# Altium footprint library 13-IC Packages-2smt2e.PcbLib: 86 footprints (part 5 of 6)
Each footprint in its own frame and in the unit in brackets; x right, y up, seen from the top. Pads: shape width x height; smd on the part's side, far side on the other; paste and mask are expansions set on the pad; w line width, h text height; cw(c..) or ccw(c..) is an arc to the next point about the centre after c.
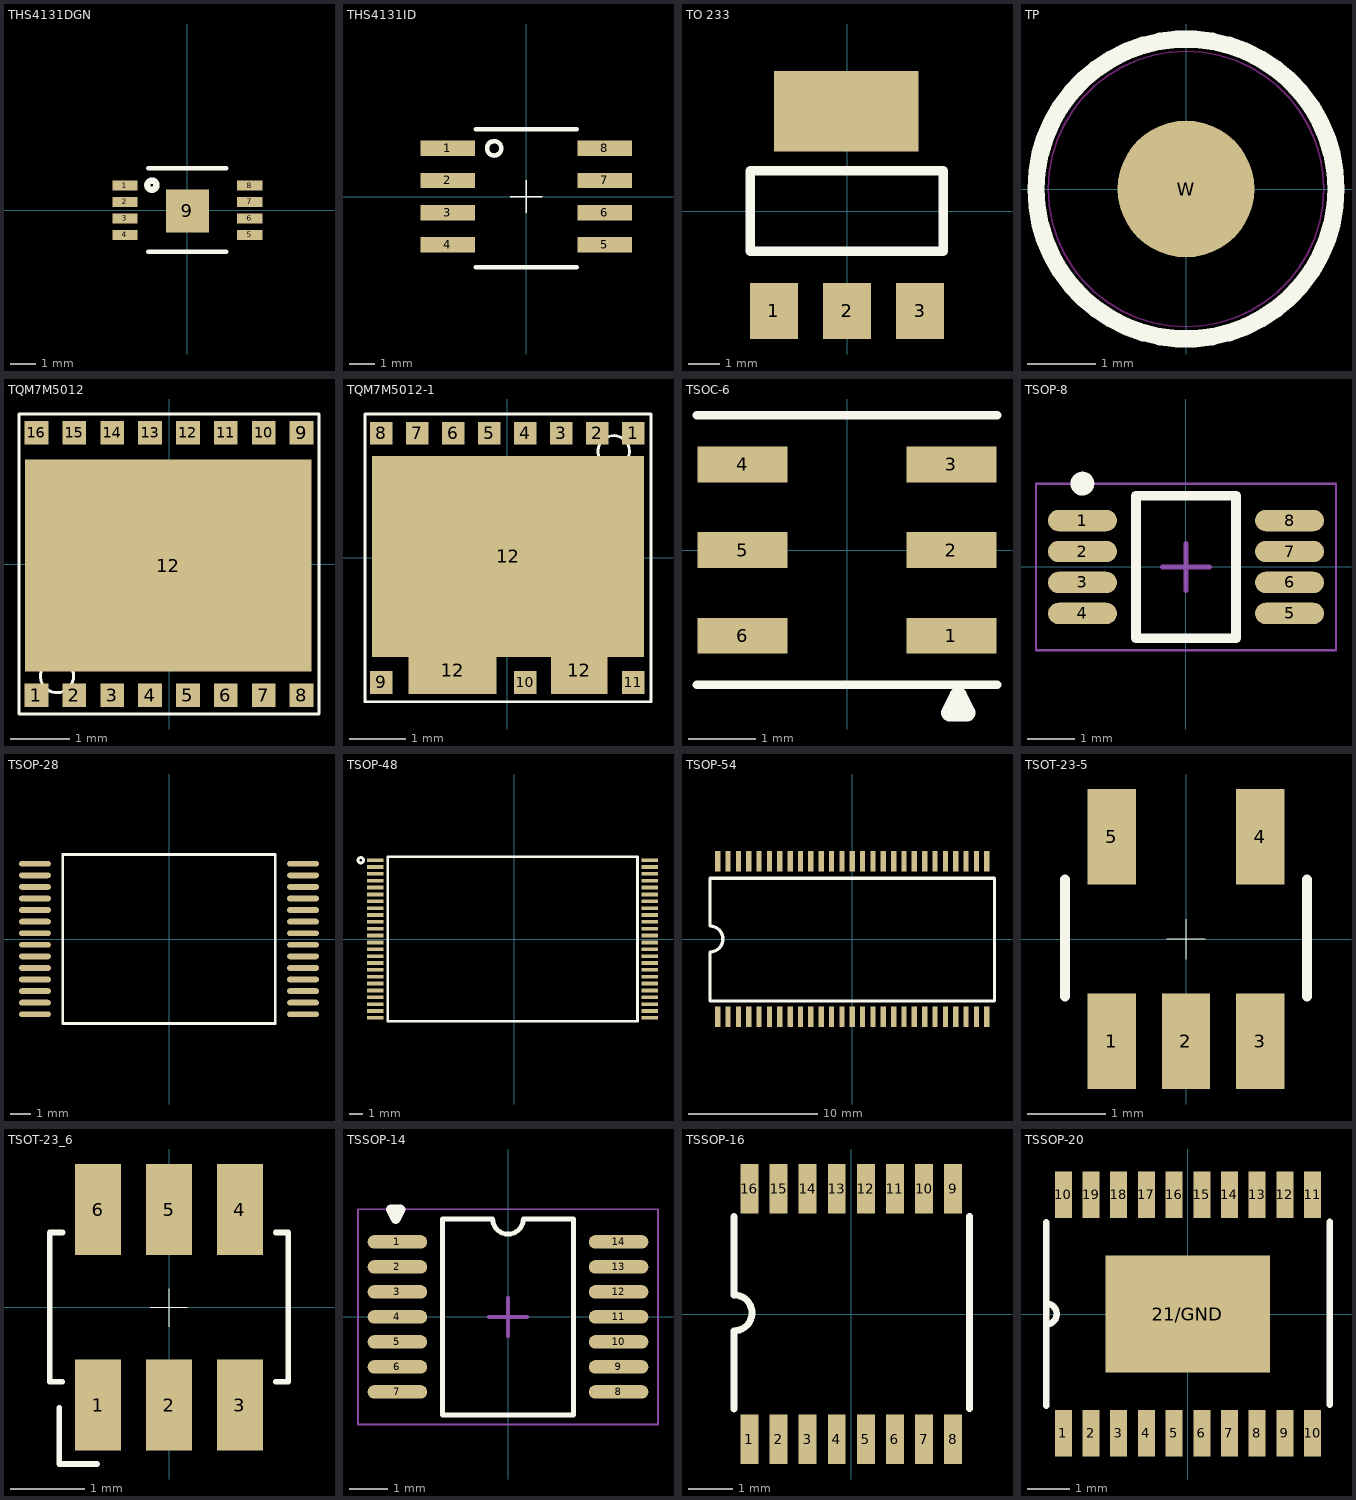
[diagram p4: the footprints below, top view; thin cyan lines are the x and y axes]

## THS4131DGN [mm]
pads (9):
  rect 1x0.4 smd mask+0.07: 1(-2.465,0.975) 2(-2.465,0.325) 3(-2.465,-0.325) 4(-2.465,-0.975) 5(2.465,-0.975) 6(2.465,-0.325) 7(2.465,0.325) 8(2.465,0.975)
  rect 1.7x1.7 smd: 9(0.001,-0.025)
Top Overlay:
  circle w0.254: c-1.399,0.991 r0.18
  lines w0.051: -0.635,0 0.635,0 ; 0,-0.635 0,0.635
  lines w0.178: -1.55,-1.65 1.55,-1.65 ; -1.55,1.65 1.55,1.65
3D body "ths4131-dgn.stp": height 1.07, standoff 0, extent -2.495,-1.524 2.495,1.526

## THS4131ID [mil]
pads (8):
  rect 85x24 smd mask+2.76: 1(-122.05,75) 2(-122.05,25) 3(-122.05,-25) 4(-122.05,-75) 5(122.05,-75) 7(122.05,25) 8(122.05,75)
  rect 85x24 smd: 6(122.05,-25)
Top Overlay:
  circle w7: c-50,75 r11.18
  lines w2: -25,0 25,0 ; 0,-25 0,25
  lines w7: -78.74,-110 78.74,-110 ; -78.74,105 78.74,105
3D body "2-0_85-ths4131.stp": height 0.79, standoff 0, extent 82.13,-91.14 160.87,-58.86
3D body "2-0_85-ths4131.stp": height 0.79, standoff 0, extent 84.13,-42.14 162.87,-9.86
3D body "2-0_85-ths4131.stp": height 0.79, standoff 0, extent 84.13,8.86 162.87,41.14
3D body "2-0_85-ths4131.stp": height 0.79, standoff 0, extent 83.63,59.36 162.37,91.64
3D body "2-0_85-ths4131.stp": height 0.79, standoff 0, extent -161.37,-91.14 -82.63,-58.86
3D body "2-0_85-ths4131.stp": height 0.79, standoff 0, extent -160.87,-41.64 -82.13,-9.36
3D body "2-0_85-ths4131.stp": height 0.79, standoff 0, extent -162.37,8.36 -83.63,40.64
3D body "2-0_85-ths4131.stp": height 0.79, standoff 0, extent -162.37,58.36 -83.63,90.64
3D body "sop-j8.stp": height 58.07, standoff 0, extent -116.93,-96.47 116.92,96.45

## TO 233 [mil]
height 66.93
pads (4):
  rect 60x70 smd mask+2.76: 1(-91,-124.29) 2(0,-124.29) 3(91,-124.29)
  rect 180x100 smd: ""(-1,124.29)
Top Overlay:
  lines w11.81: -120.43,-50 119.57,-50 119.57,50 -120.43,50 -120.43,-50
3D body "sot-233_to261aa.stp": height 70.87, standoff 0, extent -127.95,-138 127.95,137.59

## TP [mm]
height 11.7
pads (1):
  round 2 smd mask+1: W(0,0)
Top Overlay:
  circle w0.254: c0,0 r2.195
Keep-Out Layer:
  circle w0.025: c0,0 r2.017
3D body "1_016-1_016-3_tp.stp": height 0.02, standoff 0, extent -1.5,-1.5 1.5,1.5

## TQM7M5012 [mm]
pads (17):
  rect 0.4x0.4 smd mask+0.051: 1(-2.222,-2.2) 2(-1.587,-2.2) 3(-0.953,-2.2) 4(-0.318,-2.2) 5(0.318,-2.2) 6(0.953,-2.2) 7(1.587,-2.2) 8(2.222,-2.2) 9(2.222,2.2) 10(1.587,2.2) 11(0.953,2.2) 12(0.318,2.2) 13(-0.318,2.2) 14(-0.953,2.2) 15(-1.587,2.2) 16(-2.222,2.2)
  rect 4.8x3.55 smd mask+0.051: 12(-0.013,-0.025)
Top Overlay:
  circle w0.051: c-1.879,-1.88 r0.279
  lines w0.051: -2.515,-2.515 -2.515,2.515 2.515,2.515 2.515,-2.515 -2.515,-2.515
3D body "tqm7m5012.stp": height 0.9, standoff -0.1, extent -2.489,-2.489 2.511,2.511

## TQM7M5012-1 [mm]
pads (14):
  rect 0.4x0.4 smd: 1(2.222,2.2) 2(1.587,2.2) 3(0.953,2.2) 4(0.318,2.2) 5(-0.318,2.2) 6(-0.953,2.2) 7(-1.587,2.2) 8(-2.222,2.2) 9(-2.222,-2.2) 10(0.318,-2.2)
  rect 0.4x0.4 smd mask+0.051: 11(2.222,-2.2)
  rect 1.55x0.85 smd: 12(-0.965,-1.981)
  rect 4.8x3.55 smd: 12(0.013,0.025)
  rect 1x0.85 smd: 12(1.27,-1.981)
Top Overlay:
  circle w0.051: c1.879,1.88 r0.279
  lines w0.051: -2.515,-2.54 2.54,-2.54 2.54,2.54 -2.515,2.54 -2.515,-2.54
3D body "tqm7m5012.stp": height 0.9, standoff -0.1, extent -2.485,-2.5 2.515,2.5

## TSOC-6 [mm]
pads (6):
  rect 1.33x0.53 smd: 1(1.549,-1.27) 2(1.549,0) 3(1.549,1.27) 4(-1.549,1.27) 5(-1.549,0) 6(-1.549,-1.27)
Top Overlay:
  lines w0.127: -2.225,-2 2.225,-2 ; -2.225,2 2.225,2
  lines w0.254: 1.524,-2.413 1.778,-2.413 1.651,-2.159 1.524,-2.413
3D body "tsoc-6.stp": height 1.27, standoff 0.01, extent -2.095,-1.84 2.095,1.79

## TSOP-8 [mm]
pads (8):
  oval 1.45x0.45 smd mask+0.076: 1(-2.175,0.975) 2(-2.175,0.325) 3(-2.175,-0.325) 4(-2.175,-0.975) 5(2.175,-0.975) 6(2.175,-0.325) 7(2.175,0.325) 8(2.175,0.975)
Top Overlay:
  circle w0.25: c-2.175,1.75 r0.125
  lines w0.2: -1.05,-1.5 -1.05,1.5 1.05,1.5 1.05,-1.5 -1.05,-1.5
Mechanical 15:
  lines w0.05: -3.15,-1.75 -3.15,1.75 3.15,1.75 3.15,-1.75 -3.15,-1.75
  lines w0.1: -0.5,0 0.5,0 ; 0,-0.5 0,0.5
3D body "0_45-1_45.stp": height 0.02, standoff 0, extent 1.45,0.75 2.9,1.2
3D body "0_45-1_45.stp": height 0.02, standoff 0, extent 1.45,0.1 2.9,0.55
3D body "0_45-1_45.stp": height 0.02, standoff 0, extent 1.45,-0.55 2.9,-0.1
3D body "0_45-1_45.stp": height 0.02, standoff 0, extent 1.434,-1.165 2.884,-0.715
3D body "0_45-1_45.stp": height 0.02, standoff 0, extent -2.9,-1.2 -1.45,-0.75
3D body "0_45-1_45.stp": height 0.02, standoff 0, extent -2.9,-0.55 -1.45,-0.1
3D body "0_45-1_45.stp": height 0.02, standoff 0, extent -2.9,0.1 -1.45,0.55
3D body "0_45-1_45.stp": height 0.02, standoff 0, extent -2.9,0.75 -1.45,1.2
3D body "ms0p-8l.stp": height 1.1, standoff 0.03, extent -2.45,-1.5 2.45,1.5

## TSOP-28 [mil]
pads (28):
  oval 60x11 smd: 1(-252.5,141.7) 2(-252.5,119.9) 3(-252.5,98.1) 4(-252.5,76.3) 5(-252.5,54.5) 6(-252.5,32.7) 7(-252.5,10.9) 8(-252.5,-10.9) 9(-252.5,-32.7) 10(-252.5,-54.5) 11(-252.5,-76.3) 12(-252.5,-98.1) 13(-252.5,-119.9) 14(-252.5,-141.7) 15(252.5,-141.7) 16(252.5,-119.9) 17(252.5,-98.1) 18(252.5,-76.3) 19(252.5,-54.5) 20(252.5,-32.7) 21(252.5,-10.9) 22(252.5,10.9) 23(252.5,32.7) 24(252.5,54.5) 25(252.5,76.3) 26(252.5,98.1) 27(252.5,119.9) 28(252.5,141.7)
Top Overlay:
  lines w5: -200,-159 200,-159 200,159 -25,159 -200,159 -200,-159
3D body "tsop-28.stp": height 47.24, standoff -0.14, extent -259.84,-155.51 259.84,155.52

## TSOP-48 [mm]
pads (48):
  rect 1.2x0.27 smd: 1(-10.127,5.75) 2(-10.127,5.25) 3(-10.127,4.75) 4(-10.127,4.25) 5(-10.127,3.75) 6(-10.127,3.25) 7(-10.127,2.75) 8(-10.127,2.25) 9(-10.127,1.75) 10(-10.127,1.25) 11(-10.127,0.75) 12(-10.127,0.25) 13(-10.127,-0.25) 14(-10.127,-0.75) 15(-10.127,-1.25) 16(-10.127,-1.75) 17(-10.127,-2.25) 18(-10.127,-2.75) 19(-10.127,-3.25) 20(-10.127,-3.75) 21(-10.127,-4.25) 22(-10.127,-4.75) 23(-10.127,-5.25) 24(-10.127,-5.75) 25(9.873,-5.75) 26(9.873,-5.25) 27(9.873,-4.75) 28(9.873,-4.25) 29(9.873,-3.75) 30(9.873,-3.25) 31(9.873,-2.75) 32(9.873,-2.25) 33(9.873,-1.75) 34(9.873,-1.25) 35(9.873,-0.75) 36(9.873,-0.25) 37(9.873,0.25) 38(9.873,0.75) 39(9.873,1.25) 40(9.873,1.75) 41(9.873,2.25) 42(9.873,2.75) 43(9.873,3.25) 44(9.873,3.75) 45(9.873,4.25) 46(9.873,4.75) 47(9.873,5.25) 48(9.873,5.75)
Top Overlay:
  circle w0.2: c-11.201,5.74 r0.2
  lines w0.2: -9.227,-6 8.973,-6 8.973,6 -9.227,6 -9.227,-6
3D body "tsop-48.stp": height 1.2, standoff -0.02, extent -10,-6.2 10,6.2

## TSOP-54 [mil]
pads (54):
  rect 16x62 smd mask+2: 1(-409.45,-236.22) 2(-377.95,-236.22) 3(-346.46,-236.22) 4(-314.96,-236.22) 5(-283.46,-236.22) 7(-220.47,-236.22) 8(-188.98,-236.22) 9(-157.48,-236.22) 10(-125.98,-236.22) 11(-94.49,-236.22) 13(-31.5,-236.22) 14(0,-236.22) 15(31.5,-236.22) 16(62.99,-236.22) 17(94.49,-236.22) 18(125.98,-236.22) 19(157.48,-236.22) 20(188.98,-236.22) 21(220.47,-236.22) 22(251.97,-236.22) 23(283.46,-236.22) 24(314.96,-236.22) 25(346.46,-236.22) 26(377.95,-236.22) 27(409.45,-236.22) 29(377.95,236.22) 30(346.46,236.22) 31(314.96,236.22) 32(283.46,236.22) 33(251.97,236.22) 34(220.47,236.22) 35(188.98,236.22) 36(157.48,236.22) 37(125.98,236.22) 38(94.49,236.22) 39(62.99,236.22) 40(31.5,236.22) 42(-31.5,236.22) 43(-62.99,236.22) 44(-94.49,236.22) 45(-125.98,236.22) 47(-188.98,236.22) 48(-220.47,236.22) 49(-251.97,236.22) 50(-283.46,236.22) 51(-314.96,236.22) 53(-377.95,236.22)
  rect 16x62 smd mask+0: 6(-251.97,-236.22) 12(-62.99,-236.22) 28(409.45,236.22) 41(0,236.22) 46(-157.48,236.22) 52(-346.46,236.22) 54(-409.45,236.22)
Top Overlay:
  lines w10: -433.07,-188.98 433.07,-188.98 433.07,185.04 -433.07,185.04 -433.07,39.37 cw(c-433.07,0) -393.7,0 cw(c-433.07,0) -433.07,-39.37 -433.07,-188.98
3D body "tsop_54.stp": height 47.01, standoff 0, extent -438.5,-233.07 437.01,233.07

## TSOT-23-5 [mm]
pads (5):
  rect 0.62x1.22 smd mask+0.051: 1(-0.95,-1.31) 2(0,-1.31) 3(0.95,-1.31) 4(0.95,1.31) 5(-0.95,1.31)
Top Overlay:
  lines w0.005: -0.249,0.001 0.246,0.001 ; 0,-0.261 0,0.25
  lines w0.127: -1.549,-0.737 -1.549,0.763 ; 1.549,-0.737 1.549,0.763
3D body "tsot-23-5.stp": height 1, standoff 0.01, extent -1.452,-1.475 1.448,1.475

## TSOT-23_6 [mm]
pads (6):
  rect 0.62x1.22 smd mask+0.051: 1(-0.95,-1.31) 2(0.001,-1.31) 3(0.95,-1.31) 4(0.95,1.31) 5(0.001,1.31) 6(-0.95,1.31)
Top Overlay:
  lines w0.005: -0.248,0.001 0.247,0.001 ; 0.001,-0.261 0.001,0.25
  lines w0.076: -1.472,-1.345 -1.472,-2.1 -0.964,-2.1 ; -1.432,-0.999 -1.6,-0.999 -1.6,1.001 -1.426,1.001 ; 1.431,-0.999 1.6,-0.999 1.6,1.001 1.431,1.001
3D body "smd6.stp": height 1.1, standoff 0, extent -1.45,-1.4 1.45,1.4

## TSSOP-14 [mm]
pads (14):
  oval 1.55x0.35 smd: 1(-2.875,1.95) 2(-2.875,1.3) 3(-2.875,0.65) 4(-2.875,0) 5(-2.875,-0.65) 6(-2.875,-1.3) 7(-2.875,-1.95) 8(2.875,-1.95) 9(2.875,-1.3) 10(2.875,-0.65) 11(2.875,0) 12(2.875,0.65) 13(2.875,1.3) 14(2.875,1.95)
Top Overlay:
  lines w0.127: -1.7,-2.55 1.7,-2.55 1.7,2.55 0.4,2.55 cw(c0,2.552) -0.4,2.55 -1.7,2.55 -1.7,-2.55
  lines w0.254: -3.048,2.794 -2.921,2.54 -2.794,2.794 -3.048,2.794
Mechanical 15:
  lines w0.05: -3.9,-2.8 3.9,-2.8 3.9,2.8 -3.9,2.8 -3.9,-2.8
  lines w0.1: -0.5,0 0.5,0 ; 0,-0.5 0,0.5
3D body "so-g14.stp": height 1.2, standoff 0.01, extent -3.279,-2.55 3.279,2.55
3D body "0_35-1_55.stp": height 0.02, standoff 0, extent -3.645,1.781 -2.095,2.131
3D body "0_35-1_55.stp": height 0.02, standoff 0, extent -3.645,1.131 -2.095,1.481
3D body "0_35-1_55.stp": height 0.02, standoff 0, extent -3.615,0.491 -2.065,0.841
3D body "0_35-1_55.stp": height 0.02, standoff 0, extent -3.645,-0.169 -2.095,0.181
3D body "0_35-1_55.stp": height 0.02, standoff 0, extent -3.645,-0.819 -2.095,-0.469
3D body "0_35-1_55.stp": height 0.02, standoff 0, extent -3.645,-1.469 -2.095,-1.119
3D body "0_35-1_55.stp": height 0.02, standoff 0, extent -3.645,-2.119 -2.095,-1.769
3D body "0_35-1_55.stp": height 0.02, standoff 0, extent 2.105,-2.119 3.655,-1.769
3D body "0_35-1_55.stp": height 0.02, standoff 0, extent 2.105,-1.469 3.655,-1.119
3D body "0_35-1_55.stp": height 0.02, standoff 0, extent 2.105,-0.819 3.655,-0.469
3D body "0_35-1_55.stp": height 0.02, standoff 0, extent 2.105,-0.169 3.655,0.181
3D body "0_35-1_55.stp": height 0.02, standoff 0, extent 2.105,0.481 3.655,0.831
3D body "0_35-1_55.stp": height 0.02, standoff 0, extent 2.105,1.131 3.655,1.481
3D body "0_35-1_55.stp": height 0.02, standoff 0, extent 2.105,1.781 3.655,2.131

## TSSOP-16 [mm] "LT3439/"
pads (16):
  rect 0.4x1.1 smd mask+0.07: 1(-2.275,-2.8) 2(-1.625,-2.8) 3(-0.975,-2.8) 4(-0.325,-2.8) 5(0.325,-2.8) 6(0.975,-2.8) 7(1.625,-2.8) 8(2.275,-2.8) 9(2.275,2.8) 10(1.625,2.8) 11(0.975,2.8) 12(0.325,2.8) 13(-0.325,2.8) 14(-0.975,2.8) 15(-1.625,2.8) 16(-2.275,2.8)
Top Overlay:
  lines w0.152: -2.625,-0.375 ccw(c-2.618,0.025) -2.625,0.425 ; -2.622,-2.125 -2.622,-0.375 ; -2.622,0.425 -2.622,2.175 ; 2.642,-2.116 2.642,2.184
3D body "ltc-05-08-1663.stp": height 1.1, standoff 0, extent -2.436,-3.213 2.464,3.187
3D body "ltc-05-06-1663pad.stp": height 0.02, standoff 0, extent -2.476,2.248 -2.077,3.348
3D body "ltc-05-06-1663pad.stp": height 0.02, standoff 0, extent -1.829,2.248 -1.429,3.348
3D body "ltc-05-06-1663pad.stp": height 0.02, standoff 0, extent -1.181,2.248 -0.781,3.348
3D body "ltc-05-06-1663pad.stp": height 0.02, standoff 0, extent -0.521,2.248 -0.121,3.348
3D body "ltc-05-06-1663pad.stp": height 0.02, standoff 0, extent 0.127,2.248 0.527,3.348
3D body "ltc-05-06-1663pad.stp": height 0.02, standoff 0, extent 0.775,2.248 1.175,3.348
3D body "ltc-05-06-1663pad.stp": height 0.02, standoff 0, extent 1.422,2.248 1.822,3.348
3D body "ltc-05-06-1663pad.stp": height 0.02, standoff 0, extent 2.07,2.248 2.47,3.348
3D body "ltc-05-06-1663pad.stp": height 0.02, standoff 0, extent -2.476,-3.353 -2.077,-2.253
3D body "ltc-05-06-1663pad.stp": height 0.02, standoff 0, extent -1.829,-3.353 -1.429,-2.253
3D body "ltc-05-06-1663pad.stp": height 0.02, standoff 0, extent -1.181,-3.353 -0.781,-2.253
3D body "ltc-05-06-1663pad.stp": height 0.02, standoff 0, extent -0.521,-3.353 -0.121,-2.253
3D body "ltc-05-06-1663pad.stp": height 0.02, standoff 0, extent 0.127,-3.353 0.527,-2.253
3D body "ltc-05-06-1663pad.stp": height 0.02, standoff 0, extent 0.775,-3.353 1.175,-2.253
3D body "ltc-05-06-1663pad.stp": height 0.02, standoff 0, extent 1.422,-3.353 1.822,-2.253
3D body "ltc-05-06-1663pad.stp": height 0.02, standoff 0, extent 2.07,-3.353 2.47,-2.253

## TSSOP-20 [mm]
pads (21):
  rect 0.4x1.1 smd mask+0.07: 1(-2.925,-2.8) 3(-1.625,-2.8) 4(-0.975,-2.8) 5(-0.325,-2.8) 6(0.325,-2.8) 7(0.975,-2.8) 8(1.625,-2.8) 9(2.275,-2.8) 10(-2.925,2.8) 10(2.925,-2.8) 11(2.925,2.8) 12(2.275,2.8) 13(1.625,2.8) 14(0.975,2.8) 15(0.325,2.8) 16(-0.325,2.8) 17(-0.975,2.8) 18(-1.625,2.8) 19(-2.275,2.8)
  rect 0.4x1.1 smd: 2(-2.275,-2.8)
  rect 3.86x2.74 smd mask+0.07: 21/GND(0,0)
Top Overlay:
  lines w0.152: -3.327,-2.15 -3.327,2.15 ; -3.327,-0.241 ccw(c-3.323,0.002) -3.328,0.245 ; 3.327,-2.134 3.327,2.166
3D body "ltc-05-06-1663pad.stp": height 0.02, standoff 0, extent -2.476,2.248 -2.077,3.348
3D body "ltc-05-06-1663pad.stp": height 0.02, standoff 0, extent -1.829,2.248 -1.429,3.348
3D body "ltc-05-06-1663pad.stp": height 0.02, standoff 0, extent -1.181,2.248 -0.781,3.348
3D body "ltc-05-06-1663pad.stp": height 0.02, standoff 0, extent -0.521,2.248 -0.121,3.348
3D body "ltc-05-06-1663pad.stp": height 0.02, standoff 0, extent 0.127,2.248 0.527,3.348
3D body "ltc-05-06-1663pad.stp": height 0.02, standoff 0, extent 0.775,2.248 1.175,3.348
3D body "ltc-05-06-1663pad.stp": height 0.02, standoff 0, extent 1.422,2.248 1.822,3.348
3D body "ltc-05-06-1663pad.stp": height 0.02, standoff 0, extent 2.07,2.248 2.47,3.348
3D body "ltc-05-06-1663pad.stp": height 0.02, standoff 0, extent -2.476,-3.353 -2.077,-2.253
3D body "ltc-05-06-1663pad.stp": height 0.02, standoff 0, extent -1.829,-3.353 -1.429,-2.253
3D body "ltc-05-06-1663pad.stp": height 0.02, standoff 0, extent -1.181,-3.353 -0.781,-2.253
3D body "ltc-05-06-1663pad.stp": height 0.02, standoff 0, extent -0.521,-3.353 -0.121,-2.253
3D body "ltc-05-06-1663pad.stp": height 0.02, standoff 0, extent 0.127,-3.353 0.527,-2.253
3D body "ltc-05-06-1663pad.stp": height 0.02, standoff 0, extent 0.775,-3.353 1.175,-2.253
3D body "ltc-05-06-1663pad.stp": height 0.02, standoff 0, extent 1.422,-3.353 1.822,-2.253
3D body "ltc-05-06-1663pad.stp": height 0.02, standoff 0, extent 2.07,-3.353 2.47,-2.253
3D body "tssop-20.stp": height 1.2, standoff 0.04, extent -3.2,-3.206 3.2,3.206
3D body "ltc-05-06-1663pad.stp": height 0.02, standoff 0, extent 2.724,2.253 3.124,3.353
3D body "ltc-05-06-1663pad.stp": height 0.02, standoff 0, extent -3.118,2.253 -2.718,3.353
3D body "ltc-05-06-1663pad.stp": height 0.02, standoff 0, extent -3.118,-3.348 -2.718,-2.248
3D body "ltc-05-06-1663pad.stp": height 0.02, standoff 0, extent 2.724,-3.348 3.124,-2.248